# Altium footprint library Kelboy.PcbLib: 46 footprints (part 1 of 3)
Each footprint in its own frame and in the unit in brackets; x right, y up, seen from the top. Pads: shape width x height; smd on the part's side, far side on the other; paste and mask are expansions set on the pad; w line width, h text height; cw(c..) or ccw(c..) is an arc to the next point about the centre after c.
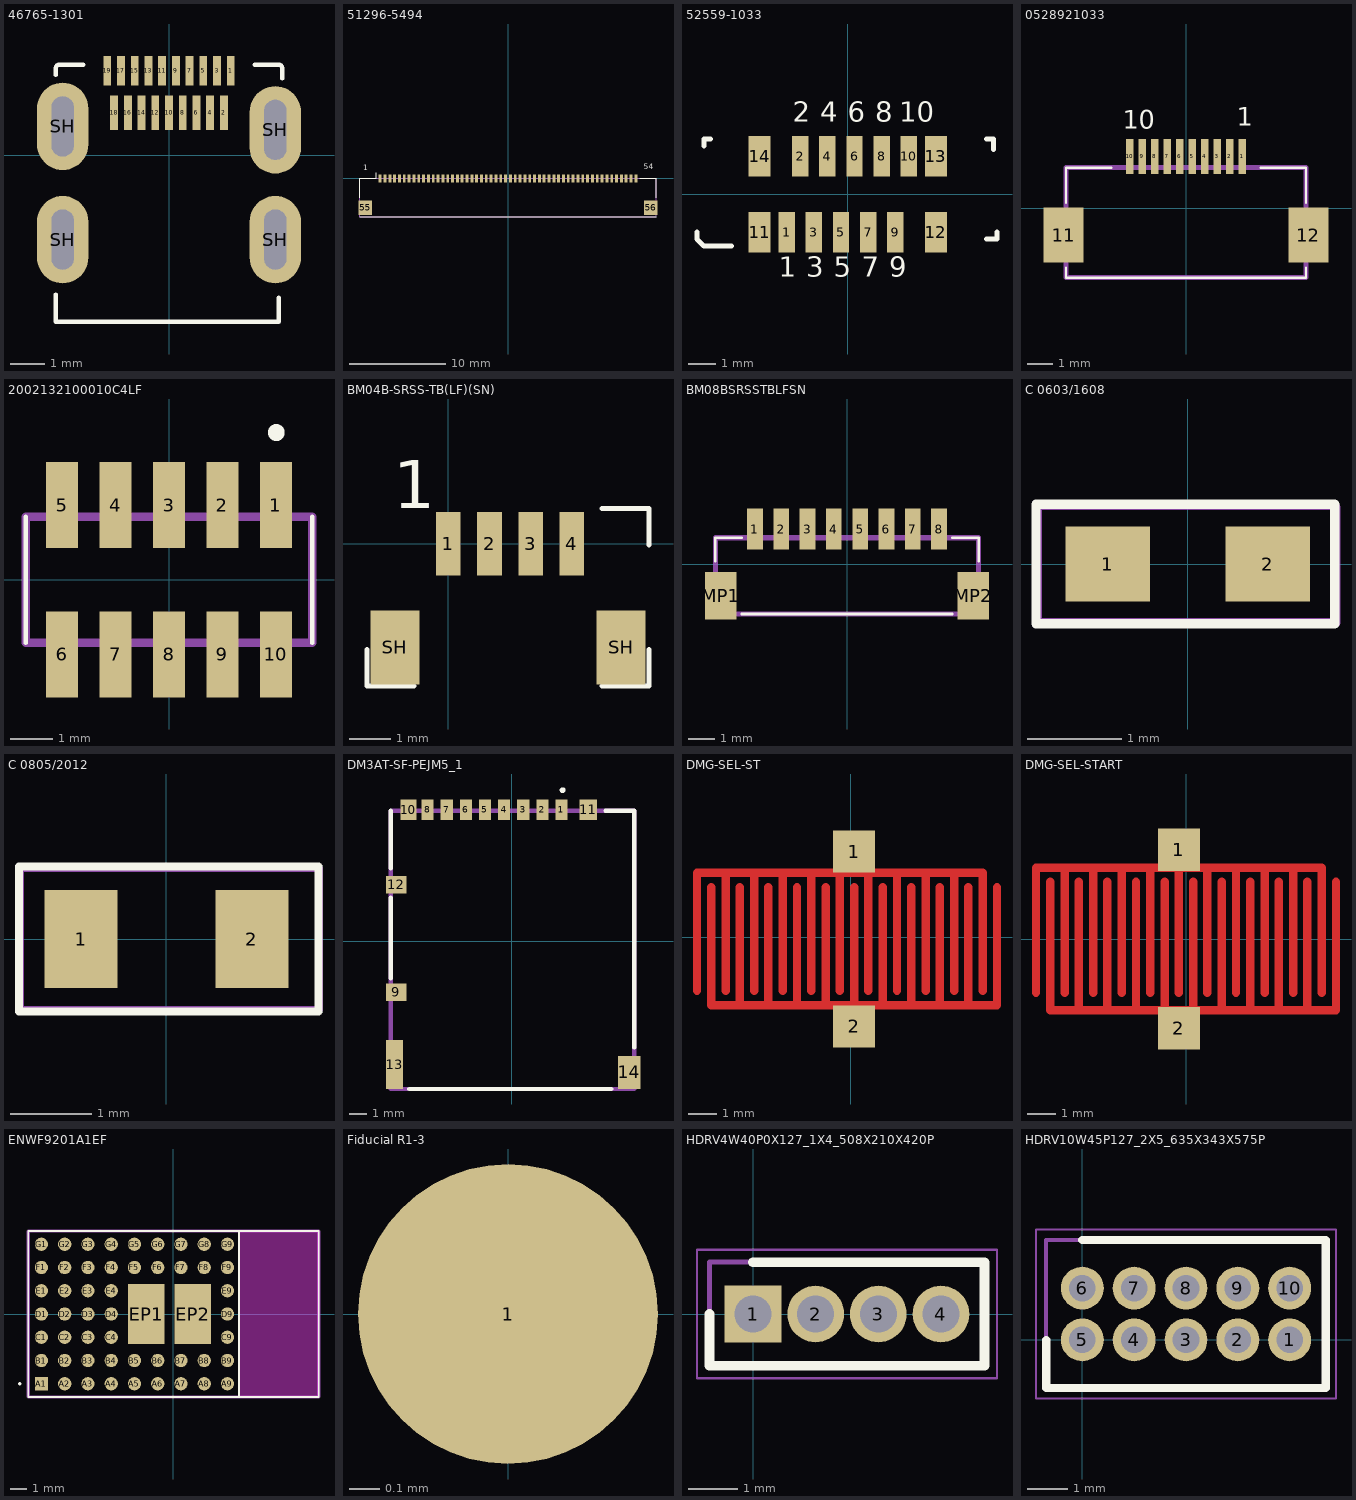
[diagram p0: the footprints below, top view; thin cyan lines are the x and y axes]

## 46765-1301 [mm]
pads (23):
  rect 0.23x0.85 smd: 1(1.8,2.463) 3(1.4,2.463) 5(1,2.463) 7(0.6,2.463) 9(0.2,2.463) 11(-0.2,2.463) 13(-0.6,2.463) 15(-1,2.463) 17(-1.4,2.463) 19(-1.8,2.463)
  rect 0.23x1 smd: 2(1.6,1.238) 4(1.2,1.238) 6(0.8,1.238) 8(0.4,1.238) 10(0,1.238) 12(-0.4,1.238) 14(-0.8,1.238) 16(-1.2,1.238) 18(-1.6,1.238)
  oval 1.5x2.55 hole 0.65 slot 1.75 at 90 deg: SH(-3.1,-2.462) SH(-3.1,0.838) SH(3.1,-2.462) SH(3.1,0.738)
Top Overlay:
  lines w0.127: -3.3,-4.062 -3.3,-4.862 3.2,-4.862 3.2,-4.162 ; -3.3,2.338 -3.3,2.538 cw(c-3.2,2.538) -3.2,2.638 -2.5,2.638 ; 2.5,2.638 3.2,2.638 cw(c3.2,2.538) 3.3,2.538 3.3,2.238
Mechanical 29:
  text ".Designator" at -1.6,-2 h1
3D body "467651301.stp": height 3.02, standoff -0.5, extent -3.275,-4.898 3.225,2.602

## 51296-5494 [mm]
pads (56):
  rect 0.3x0.8 smd: 1(-13.25,0) 2(-12.75,0) 3(-12.25,0) 4(-11.75,0) 5(-11.25,0) 6(-10.75,0) 7(-10.25,0) 8(-9.75,0) 9(-9.25,0) 10(-8.75,0) 11(-8.25,0) 12(-7.75,0) 13(-7.25,0) 14(-6.75,0) 15(-6.25,0) 16(-5.75,0) 17(-5.25,0) 18(-4.75,0) 19(-4.25,0) 20(-3.75,0) 21(-3.25,0) 22(-2.75,0) 23(-2.25,0) 24(-1.75,0) 25(-1.25,0) 26(-0.75,0) 27(-0.25,0) 28(0.25,0) 29(0.75,0) 30(1.25,0) 31(1.75,0) 32(2.25,0) 33(2.75,0) 34(3.25,0) 35(3.75,0) 36(4.25,0) 37(4.75,0) 38(5.25,0) 39(5.75,0) 40(6.25,0) 41(6.75,0) 42(7.25,0) 43(7.75,0) 44(8.25,0) 45(8.75,0) 46(9.25,0) 47(9.75,0) 48(10.25,0) 49(10.75,0) 50(11.25,0) 51(11.75,0) 52(12.25,0) 53(12.75,0) 54(13.25,0)
  rect 1.4x1.5 smd: 55(-14.8,-3.05) 56(14.8,-3.05)
Top Overlay:
  lines w0.1: -15.35,-3.955 15.35,-3.955 ; -15.35,-1.978 -15.35,0 -13.668,0 -13.668,0.589 ; 13.668,0 15.35,0 ; 13.711,0 15.35,0 ; 15.35,-1.978 15.35,0
  text "1" at -14.986,0.635 h1
  text "54" at 14.097,0.762 h1
Mechanical 29:
  lines w0.1: -15.35,-3.955 -15.35,0 15.35,0 15.35,-3.955 -15.35,-3.955
  text ".Designator" at -3.048,-2.54 h1
3D body "51296-5494.stp": height 1.25, standoff -0.05, extent -15.367,-4.182 15.333,0.118

## 52559-1033 [mm]
pads (14):
  rect 0.6x1.5 smd: 1(-2.25,-1.4) 2(-1.75,1.4) 3(-1.25,-1.4) 4(-0.75,1.394) 5(-0.25,-1.4) 6(0.25,1.394) 7(0.75,-1.4) 8(1.25,1.394) 9(1.75,-1.4) 10(2.25,1.394)
  rect 0.8x1.5 smd: 11(-3.25,-1.4) 12(3.25,-1.4) 13(3.25,1.4) 14(-3.25,1.4)
Top Overlay:
  lines w0.18: -5.552,-1.4 -5.552,-1.654 -5.298,-1.908 -4.282,-1.908 ; -5.298,1.775 -5.298,2.029 -5.044,2.029 ; 5.116,-1.654 5.497,-1.654 5.497,-1.4 ; 5.116,2.029 5.37,2.029 5.37,1.648
  text "2" at -2.032,2.413 h1.27
  text "4" at -1.016,2.413 h1.27
  text "6" at 0,2.413 h1.27
  text "9" at 1.524,-3.302 h1.27
  text "7" at 0.508,-3.302 h1.27
  text "5" at -0.508,-3.302 h1.27
  text "1" at -2.54,-3.302 h1.27
  text "3" at -1.524,-3.302 h1.27
  text "8" at 1.016,2.413 h1.27
  text "10" at 1.905,2.413 h1.27
Mechanical 29:
  text ".Designator" at -3.012,-0.384 h1.27
3D body "525591033.stp": height 3.9, standoff 0, extent -5.314,-1.598 5.386,1.902

## 0528921033 [mm]
pads (12):
  rect 0.3x1.4 smd: 1(2.25,2.075) 2(1.75,2.075) 3(1.25,2.075) 4(0.75,2.075) 5(0.25,2.075) 6(-0.25,2.075) 7(-0.75,2.075) 8(-1.25,2.075) 9(-1.75,2.075) 10(-2.25,2.075)
  rect 1.6x2.2 smd: 11(-4.9,-1.075) 12(4.9,-1.075)
Top Overlay:
  lines w0.1: -4.8,-2.375 -4.8,-2.775 4.8,-2.775 4.8,-2.375 ; -4.8,0.225 -4.8,1.625 -3,1.625 ; 3,1.625 4.8,1.625 4.8,0.225
  text "1" at 2.032,3.048 h1.27
  text "10" at -2.54,2.921 h1.27
Mechanical 13:
  lines w0.2: -4.8,-2.775 4.8,-2.775 4.8,1.625 -4.8,1.625 -4.8,-2.775
Mechanical 29:
  text ".Designator" at -3.937,-1.619 h1.52
3D body "528921033.stp": height 2, standoff -0.04, extent -5.2,-3.294 5.2,2.206

## 2002132100010C4LF [mm]
pads (10):
  rect 0.76x2.05 smd: 1(2.54,1.775) 2(1.27,1.775) 3(0,1.775) 4(-1.27,1.775) 5(-2.54,1.775) 6(-2.54,-1.775) 7(-1.27,-1.775) 8(0,-1.775) 9(1.27,-1.775) 10(2.54,-1.775)
Top Overlay:
  lines w0.1: -3.405,-1.5 -3.405,1.5 ; 3.405,-1.5 3.405,1.5
  lines w0.3: 2.5,3.5 cw(c2.55,3.5) 2.6,3.5 cw(c2.55,3.5) 2.5,3.5
Mechanical 13:
  lines w0.2: -3.405,-1.5 -3.405,1.5 3.405,1.5 3.405,-1.5 -3.405,-1.5
Mechanical 29:
  text ".Designator" at -1.905,-0.381 h1
3D body "20021321-1010xxlfc.stp": height 4.5, standoff 0, extent -3.405,-2.25 3.405,2.25

## BM04B-SRSS-TB(LF)(SN) [mm]
pads (6):
  rect 0.6x1.55 smd: 1(0,0) 2(1,0) 3(2,0) 4(3,0)
  rect 1.2x1.8 smd: SH(-1.3,-2.52) SH(4.2,-2.52)
Top Overlay:
  lines w0.127: -1.979,-2.573 -1.979,-3.462 -0.836,-3.462 ; 3.736,-3.462 4.879,-3.462 4.879,-2.573 ; 3.736,0.856 4.879,0.856 4.879,-0.033
  text "1" at -1.344,0.475 h2
3D body "BM04B-SRSS-TB-LF--SN---3DModel-STEP-56544.STEP": height 4.35, standoff 0, extent -1.603,-3.048 4.397,0.552

## BM08BSRSSTBLFSN [mm]
pads (10):
  rect 0.6x1.55 smd: 1(-3.5,1.325) 2(-2.5,1.325) 3(-1.5,1.325) 4(-0.5,1.325) 5(0.5,1.325) 6(1.5,1.325) 7(2.5,1.325) 8(3.5,1.325)
  rect 1.2x1.8 smd: MP1(-4.8,-1.2) MP2(4.8,-1.2)
Top Overlay:
  lines w0.1: -5,0.1 -5,1 -4,1 ; -4,-1.9 4,-1.9 ; 4,1 5,1 5,0.1
Mechanical 13:
  lines w0.2: -5,-1.9 5,-1.9 5,1 -5,1 -5,-1.9
Mechanical 29:
  text ".Designator" at -2.032,-1.143 h1
3D body "BM08B-SRSS-TB.STEP": height 4.3, standoff -0.02, extent -5,-1.778 5,1.822

## C 0603/1608 [mm]
pads (2):
  rect 0.9x0.8 smd: 1(-0.85,0) 2(0.85,0)
Top Overlay:
  lines w0.1: -1.612,-0.635 -1.612,0.635 1.563,0.635 1.563,-0.635 -1.612,-0.635
Mechanical 29:
  lines w0.1: -1.6,-0.625 -1.6,0.625 1.55,0.625 1.575,0.6 1.575,-0.625 -1.6,-0.625
  text ".Designator" at -1.4,-0.4 h0.8
3D body: height 0.64, standoff 0, extent -0.85,-0.4 0.85,0.4
3D body: height 0.64, standoff 0, extent -1.3,-0.4 -0.85,0.4
3D body: height 0.64, standoff 0, extent 0.85,-0.4 1.3,0.4

## C 0805/2012 [mm]
pads (2):
  rect 0.9x1.2 smd: 1(-1.05,0) 2(1.05,0)
Top Overlay:
  lines w0.1: -1.812,-0.889 1.871,-0.889 1.871,0.889 -1.812,0.889 -1.812,-0.889
Mechanical 29:
  lines w0.1: -1.8,-0.875 1.875,-0.875 1.875,0.875 -1.775,0.875 -1.8,0.85 -1.8,-0.875
  text ".Designator" at -1.675,-0.55 h1
3D body: height 0.64, standoff 0, extent -1.05,-0.6 1.1,0.6
3D body: height 0.64, standoff 0, extent -1.5,-0.6 -1.05,0.6
3D body: height 0.64, standoff 0, extent 1.1,-0.6 1.5,0.6

## DM3AT-SF-PEJM5_1 [mm]
pads (14):
  rect 0.7x1.2 smd: 1(2.85,7.55) 2(1.75,7.55) 3(0.65,7.55) 4(-0.45,7.55) 5(-1.55,7.55) 6(-2.65,7.55) 7(-3.75,7.55) 8(-4.85,7.55)
  rect 1.2x1 smd: 9(-6.65,-2.95) 12(-6.65,3.25)
  rect 0.9x1.2 smd: 10(-5.95,7.55)
  rect 1x1.2 smd: 11(4.4,7.55)
  rect 1x2.8 smd: 13(-6.75,-7.1)
  rect 1.3x1.9 smd: 14(6.75,-7.55)
Top Overlay:
  circle w0.2: c2.917,8.679 r0.068
  lines w0.254: -6.959,-2.132 -6.959,2.481 ; -6.959,4.19 -6.959,7.493 ; -5.893,-8.507 5.725,-8.507 ; 5.384,7.493 7.041,7.493 7.041,-6.118
Mechanical 13:
  lines w0.254: -6.959,-8.507 -6.959,7.493 7.041,7.493 7.041,-8.507 -6.959,-8.507
Mechanical 29:
  text ".Designator" at -2.667,-1.905 h1
3D body "DM3AT-SF-PEJM5.stp": height 1.68, standoff 0, extent -6.858,-8.53 6.992,7.62

## DMG-SEL-ST [mm]
pads (2):
  rect 1.5x1.5 smd: 1(0.127,3.048) 2(0.127,-3.175)
Top Layer:
  lines w0.3: -5.461,-1.905 -5.461,2.286 4.699,2.286 4.699,-1.905 ; -4.953,1.778 -4.953,-2.413 5.207,-2.413 5.207,1.778 ; -4.445,-1.905 -4.445,2.286 ; -3.937,-2.413 -3.937,1.778 ; -3.429,-1.905 -3.429,2.286 ; -2.921,-2.413 -2.921,1.778 ; -2.413,-1.905 -2.413,2.286 ; -1.905,-2.286 -1.905,1.778 ; -1.397,-1.905 -1.397,2.159 ; -0.889,-2.413 -0.889,1.778 ; -0.381,-1.905 -0.381,2.286 ; 0.127,-2.286 0.127,1.778 ; 0.635,-1.905 0.635,2.286 ; 1.143,-2.286 1.143,1.778 ; 1.651,-1.905 1.651,2.286 ; 2.159,-2.413 2.159,1.778 ; 2.667,-1.905 2.667,2.286 ; 3.175,-2.286 3.175,1.778 ; 3.683,-1.905 3.683,2.286 ; 4.191,-2.413 4.191,1.778

## DMG-SEL-START [mm]
pads (2):
  rect 1.5x1.5 smd: 1(-0.254,3.175) 2(-0.254,-3.175)
Top Layer:
  lines w0.3: -5.334,-1.905 -5.334,2.54 4.826,2.54 4.826,-1.905 ; -4.826,2.032 -4.826,-2.54 5.334,-2.54 5.334,2.032 ; -4.318,-1.905 -4.318,2.54 ; -3.81,-2.54 -3.81,2.032 ; -3.302,-1.905 -3.302,2.54 ; -2.794,-2.54 -2.794,2.032 ; -2.286,-1.905 -2.286,2.54 ; -1.778,-2.54 -1.778,2.032 ; -1.27,-1.905 -1.27,2.54 ; -0.762,-2.54 -0.762,2.032 ; -0.254,-1.905 -0.254,2.54 ; 0.254,-2.54 0.254,2.032 ; 0.762,-1.905 0.762,2.54 ; 1.27,-2.54 1.27,2.032 ; 1.778,-1.905 1.778,2.54 ; 2.286,-2.54 2.286,2.032 ; 2.794,-1.905 2.794,2.54 ; 3.302,-2.54 3.302,2.032 ; 3.81,-1.905 3.81,2.54 ; 4.318,-2.476 4.318,2.032

## ENWF9201A1EF [mm]
pads (53):
  rect 0.8x0.8 smd: A1(-7.95,-4.2)
  round 0.8 smd: A2(-6.55,-4.2) A3(-5.15,-4.2) A4(-3.75,-4.2) A5(-2.35,-4.2) A6(-0.95,-4.2) A7(0.45,-4.2) A8(1.85,-4.2) A9(3.25,-4.2) B1(-7.95,-2.8) B2(-6.55,-2.8) B3(-5.15,-2.8) B4(-3.75,-2.8) B5(-2.35,-2.8) B6(-0.95,-2.8) B7(0.45,-2.8) B8(1.85,-2.8) B9(3.25,-2.8) C1(-7.95,-1.4) C2(-6.55,-1.4) C3(-5.15,-1.4) C4(-3.75,-1.4) C9(3.25,-1.4) D1(-7.95,0) D2(-6.55,0) D3(-5.15,0) D4(-3.75,0) D9(3.25,0) E1(-7.95,1.4) E2(-6.55,1.4) E3(-5.15,1.4) E4(-3.75,1.4) E9(3.25,1.4) F1(-7.95,2.8) F2(-6.55,2.8) F3(-5.15,2.8) F4(-3.75,2.8) F5(-2.35,2.8) F6(-0.95,2.8) F7(0.45,2.8) F8(1.85,2.8) F9(3.25,2.8) G1(-7.95,4.2) G2(-6.55,4.2) G3(-5.15,4.2) G4(-3.75,4.2) G5(-2.35,4.2) G6(-0.95,4.2) G7(0.45,4.2) G8(1.85,4.2) G9(3.25,4.2)
  rect 2.2x3.6 smd: EP1(-1.65,0) EP2(1.15,0)
Top Overlay:
  lines w0.1: -9.3,-4.2 cw(c-9.25,-4.2) -9.2,-4.2 cw(c-9.25,-4.2) -9.3,-4.2 ; -8.75,-5 8.75,-5 8.75,5 -8.75,5 -8.75,-5
  lines w0.127: 3.937,-4.953 3.937,4.953
Keep-Out Layer:
  region: 3.937,-4.953 3.937,4.953 8.763,4.953 8.763,-4.953
Mechanical 29:
  lines w0.2: -8.75,-5 8.75,-5 8.75,5 -8.75,5 -8.75,-5
  text ".Designator" at -4.318,-0.254 h2
3D body "ENW-F9201A1EF.stp": height 2.65, standoff 0, extent -8.75,-5 8.75,5

## Fiducial R1-3 [mm]
pads (1):
  round 1 smd paste-1 mask+1.5: 1(0,0)

## HDRV4W40P0X127_1X4_508X210X420P [mm]
pads (4):
  rect 1.15x1.15 hole 0.75: 1(0,0)
  round 1.15 hole 0.75: 2(1.27,0) 3(2.54,0) 4(3.81,0)
Top Overlay:
  lines w0.2: -0.885,0 -0.885,-1.05 4.695,-1.05 4.695,1.05 0,1.05
Mechanical 13:
  lines w0.1: -0.885,-1.05 4.695,-1.05 4.695,1.05 -0.885,1.05 -0.885,-1.05
Mechanical 15:
  lines w0.05: -1.135,-1.3 4.945,-1.3 4.945,1.3 -1.135,1.3 -1.135,-1.3
Mechanical 29:
  text ".Designator" at -0.127,-0.381 h1
3D body "M50-3530442.stp": height 4.2, standoff -2.5, extent -0.635,-1.05 4.445,1.05

## HDRV10W45P127_2X5_635X343X575P [mm]
pads (10):
  round 1.05 hole 0.65: 1(5.08,0) 2(3.81,0) 3(2.54,0) 4(1.27,0) 5(0,0) 6(0,1.27) 7(1.27,1.27) 8(2.54,1.27) 9(3.81,1.27) 10(5.08,1.27)
Top Overlay:
  lines w0.2: -0.885,0 -0.885,-1.18 5.965,-1.18 5.965,2.45 0,2.45
Mechanical 13:
  lines w0.1: -0.885,-1.18 -0.885,2.45 5.965,2.45 5.965,-1.18 -0.885,-1.18
Mechanical 15:
  lines w0.05: -1.135,-1.43 -1.135,2.7 6.215,2.7 6.215,-1.43 -1.135,-1.43
Mechanical 29:
  text ".Designator" at 0.635,0.254 h1
3D body "20021111-00010T1LF.stp": height 5.75, standoff -2.5, extent -0.635,-1.08 5.715,2.35